# Altium footprint library Altium_Lib.PcbLib: 334 footprints (part 16 of 21)
Each footprint in its own frame and in the unit in brackets; x right, y up, seen from the top. Pads: shape width x height; smd on the part's side, far side on the other; paste and mask are expansions set on the pad; w line width, h text height; cw(c..) or ccw(c..) is an arc to the next point about the centre after c.
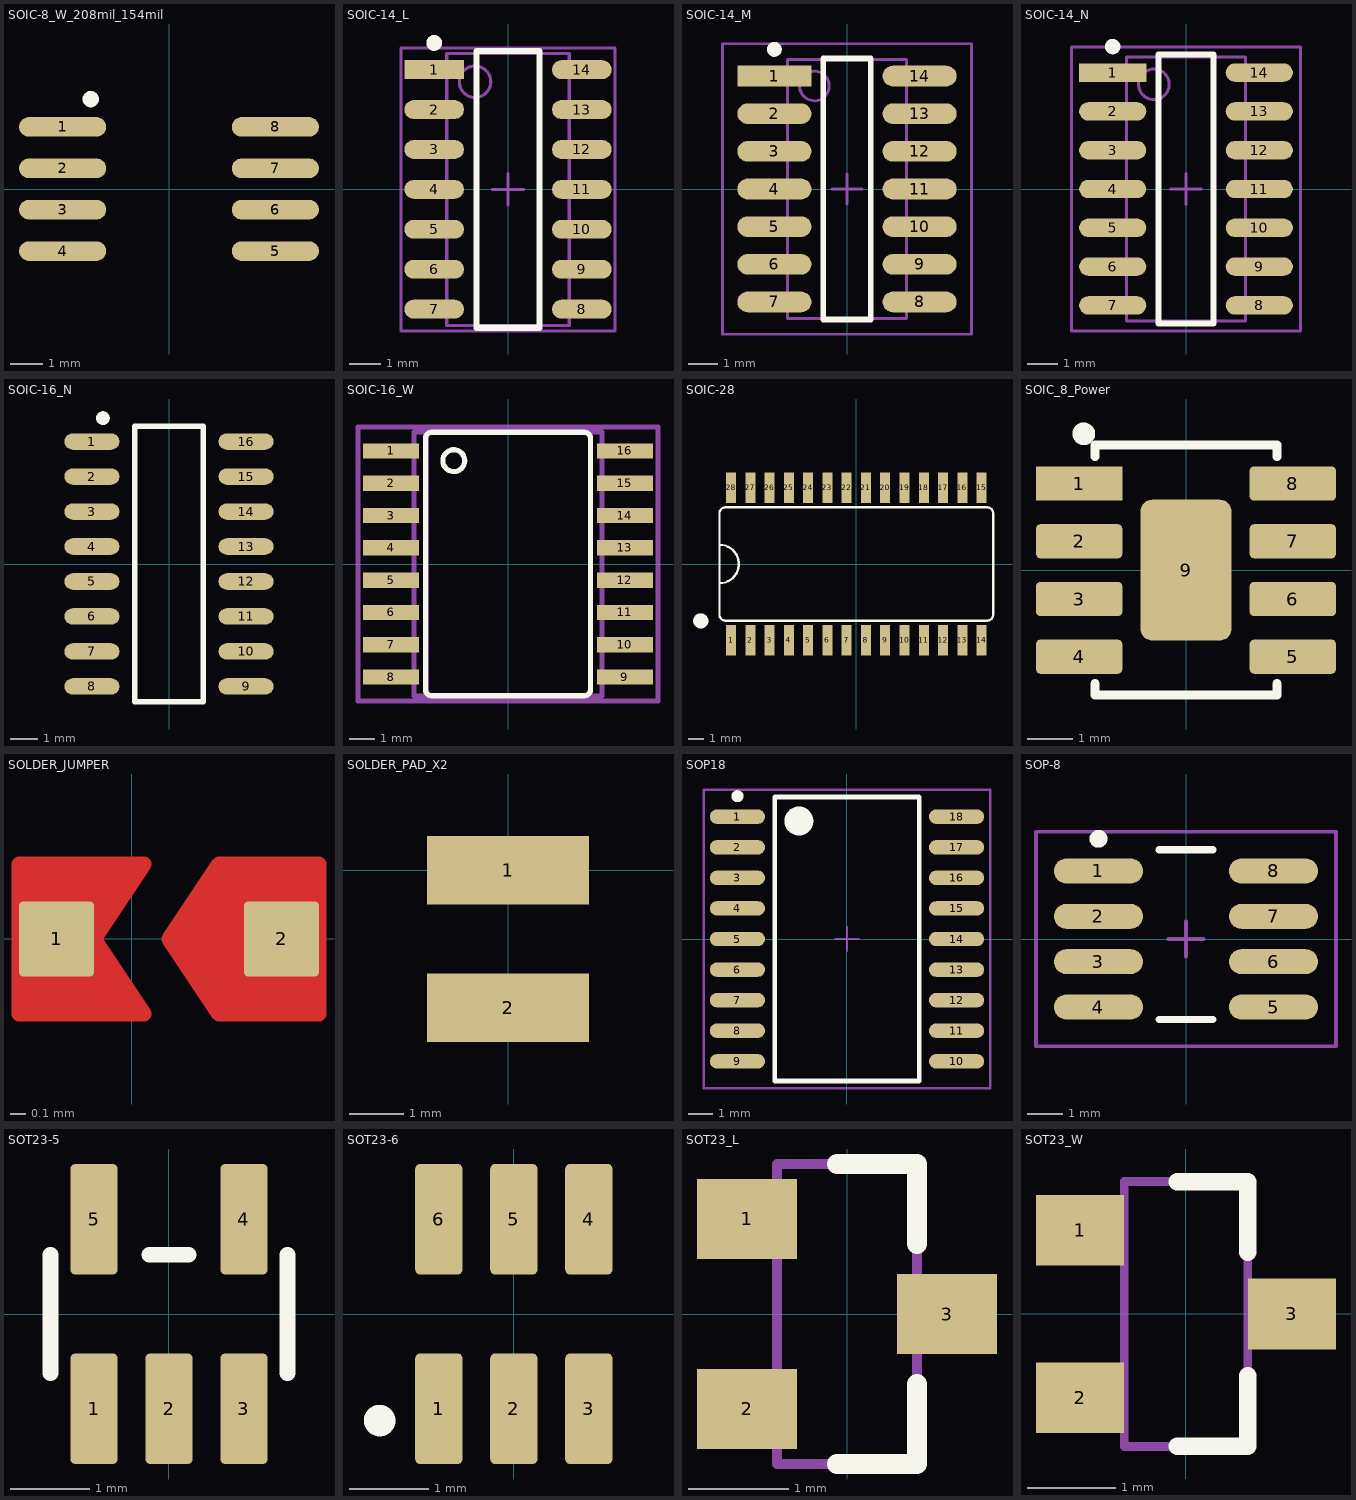
[diagram p15: the footprints below, top view; thin cyan lines are the x and y axes]

## SOIC-8_W_208mil_154mil [mm] "SOIC, 8-Leads, Body 4.9x3.9mm, Pitch 1.27mm, IPC Medium Density"
height 1.75
pads (8):
  oval 2.675x0.6 smd: 1(-3.263,1.905) 2(-3.263,0.635) 3(-3.263,-0.635) 4(-3.263,-1.905) 5(3.262,-1.905) 6(3.262,-0.635) 7(3.262,0.635) 8(3.262,1.905)
Top Overlay:
  circle w0.25: c-2.4,2.755 r0.125
3D body "User Library-SOIC8_Wide_5mmx5mm.step": height 1.75, standoff -0.01, extent -4.052,-2.73 4.05,2.73

## SOIC-14_L [mm] "SOIC, 14-Leads, Body 8.7x3.9mm, Pitch 1.27mm, IPC High Density"
height 1.75
pads (14):
  rect 1.9x0.6 smd: 1(-2.35,3.81)
  oval 1.9x0.6 smd: 2(-2.35,2.54) 3(-2.35,1.27) 4(-2.35,0) 5(-2.35,-1.27) 6(-2.35,-2.54) 7(-2.35,-3.81) 8(2.35,-3.81) 9(2.35,-2.54) 10(2.35,-1.27) 11(2.35,0) 12(2.35,1.27) 13(2.35,2.54) 14(2.35,3.81)
Top Overlay:
  circle w0.25: c-2.35,4.66 r0.125
  lines w0.2: -1,-4.4 1,-4.4 1,4.4 -1,4.4 -1,-4.4
Mechanical 13:
  circle w0.1: c-1.05,3.425 r0.5
  lines w0.1: -1.95,-4.325 1.95,-4.325 1.95,4.325 -1.95,4.325 -1.95,-4.325
Mechanical 15:
  lines w0.1: -0.5,0 0.5,0 ; 0,-0.5 0,0.5 ; -3.4,-4.5 3.4,-4.5 3.4,4.5 -3.4,4.5 -3.4,-4.5
3D body "SOIC_14.STEP": height 1.75, standoff 0, extent -3.1,-4.375 3.1,4.375

## SOIC-14_M [mm] "SOIC, 14-Leads, Body 8.7x3.9mm, Pitch 1.27mm, IPC Low Density"
height 1.75
pads (14):
  rect 2.5x0.7 smd: 1(-2.45,3.81)
  oval 2.5x0.7 smd: 2(-2.45,2.54) 3(-2.45,1.27) 4(-2.45,0) 5(-2.45,-1.27) 6(-2.45,-2.54) 7(-2.45,-3.81) 8(2.45,-3.81) 9(2.45,-2.54) 10(2.45,-1.27) 11(2.45,0) 12(2.45,1.27) 13(2.45,2.54) 14(2.45,3.81)
Top Overlay:
  circle w0.25: c-2.45,4.71 r0.125
  lines w0.2: -0.8,-4.4 -0.8,4.4 0.8,4.4 0.8,-4.4 -0.8,-4.4
Mechanical 13:
  circle w0.1: c-1.1,3.475 r0.5
  lines w0.1: -2,-4.375 -2,4.375 2,4.375 2,-4.375 -2,-4.375
Mechanical 15:
  lines w0.1: -0.5,0 0.5,0 ; 0,-0.5 0,0.5 ; -4.2,-4.9 -4.2,4.9 4.2,4.9 4.2,-4.9 -4.2,-4.9
3D body "SOIC_14.STEP": height 1.75, standoff 0, extent -3.1,-4.375 3.1,4.375

## SOIC-14_N [mm] "SOIC, 14-Leads, Body 8.7x3.9mm, Pitch 1.27mm, IPC Medium Density"
height 1.75
pads (14):
  rect 2.2x0.6 smd: 1(-2.4,3.81)
  oval 2.2x0.6 smd: 2(-2.4,2.54) 3(-2.4,1.27) 4(-2.4,0) 5(-2.4,-1.27) 6(-2.4,-2.54) 7(-2.4,-3.81) 8(2.4,-3.81) 9(2.4,-2.54) 10(2.4,-1.27) 11(2.4,0) 12(2.4,1.27) 13(2.4,2.54) 14(2.4,3.81)
Top Overlay:
  circle w0.25: c-2.4,4.66 r0.125
  lines w0.2: -0.9,-4.4 0.9,-4.4 0.9,4.4 -0.9,4.4 -0.9,-4.4
Mechanical 13:
  circle w0.1: c-1.05,3.425 r0.5
  lines w0.1: -1.95,-4.325 1.95,-4.325 1.95,4.325 -1.95,4.325 -1.95,-4.325
Mechanical 15:
  lines w0.1: -0.5,0 0.5,0 ; 0,-0.5 0,0.5 ; -3.75,-4.65 3.75,-4.65 3.75,4.65 -3.75,4.65 -3.75,-4.65
3D body "SOIC_14.STEP": height 1.75, standoff 0, extent -3.1,-4.375 3.1,4.375

## SOIC-16_N [mm] "SOIC, 16-Leads, Body 9.9x3.9mm, Pitch 1.27mm, IPC Medium Density"
height 1.75
pads (16):
  oval 2x0.6 smd: 1(-2.8,4.445) 2(-2.8,3.175) 3(-2.8,1.905) 4(-2.8,0.635) 5(-2.8,-0.635) 6(-2.8,-1.905) 7(-2.8,-3.175) 8(-2.8,-4.445) 9(2.8,-4.445) 10(2.8,-3.175) 11(2.8,-1.905) 12(2.8,-0.635) 13(2.8,0.635) 14(2.8,1.905) 15(2.8,3.175) 16(2.8,4.445)
Top Overlay:
  circle w0.25: c-2.4,5.295 r0.125
  lines w0.2: -1.25,-5 -1.25,5 1.25,5 1.25,-5 -1.25,-5
3D body "SOIC_16_150mil.STEP": height 1.75, standoff 0, extent -3.1,-5 3.1,5

## SOIC-16_W [mm]
pads (16):
  rect 2.2x0.6 smd: 1(-4.6,4.445) 2(-4.6,3.175) 3(-4.6,1.905) 4(-4.6,0.635) 5(-4.6,-0.635) 6(-4.6,-1.905) 7(-4.6,-3.175) 8(-4.6,-4.445) 9(4.6,-4.445) 10(4.6,-3.175) 11(4.6,-1.905) 12(4.6,-0.635) 13(4.6,0.635) 14(4.6,1.905) 15(4.6,3.175) 16(4.6,4.445)
Top Overlay:
  circle w0.203: c-2.134,4.064 r0.431
  lines w0.203: -3.251,-4.928 ccw(c-2.997,-4.928) -2.997,-5.182 2.997,-5.182 ccw(c2.997,-4.928) 3.251,-4.928 3.251,4.928 ccw(c2.997,4.928) 2.997,5.182 -2.997,5.182 ccw(c-2.997,4.928) -3.251,4.928 -3.251,-4.928
Mechanical 16:
  region: -5.32,4.69 -5.32,4.2 -3.8,4.2 -3.8,4.69
  region: -5.32,3.42 -5.32,2.93 -3.8,2.93 -3.8,3.42
  region: -5.32,2.15 -5.32,1.66 -3.8,1.66 -3.8,2.15
  region: -5.32,0.88 -5.32,0.39 -3.8,0.39 -3.8,0.88
  region: -5.32,-0.39 -5.32,-0.88 -3.8,-0.88 -3.8,-0.39
  region: -5.32,-1.66 -5.32,-2.15 -3.8,-2.15 -3.8,-1.66
  region: -5.32,-2.93 -5.32,-3.42 -3.8,-3.42 -3.8,-2.93
  region: -5.32,-4.2 -5.32,-4.69 -3.8,-4.69 -3.8,-4.2
  region: 3.8,-4.2 3.8,-4.69 5.32,-4.69 5.32,-4.2
  region: 3.8,-2.93 3.8,-3.42 5.32,-3.42 5.32,-2.93
  region: 3.8,-1.66 3.8,-2.15 5.32,-2.15 5.32,-1.66
  region: 3.8,-0.39 3.8,-0.88 5.32,-0.88 5.32,-0.39
  region: 3.8,0.88 3.8,0.39 5.32,0.39 5.32,0.88
  region: 3.8,2.15 3.8,1.66 5.32,1.66 5.32,2.15
  region: 3.8,3.42 3.8,2.93 5.32,2.93 5.32,3.42
  region: 3.8,4.69 3.8,4.2 5.32,4.2 5.32,4.69
  lines w0.2: -5.9,-5.395 -5.9,5.395 5.9,5.395 5.9,-5.395 -5.9,-5.395
  lines w0.203: -3.2,-5.19 -3.2,5.19 ; -3.2,-5.19 3.7,-5.19 3.7,5.19 -3.2,5.19 ; -3.2,-5.19 -3.7,-5.19 -3.7,5.19 -3.2,5.19
3D body "User Library-SOIC16_Wide_JEDEC_MS-013AA.STEP": height 2.72, standoff 0.07, extent -5.425,-5.25 5.205,5.25

## SOIC-28 [mil] "SO28L"
pads (28):
  rect 26x80 smd: 1(-325,-198) 2(-275,-198) 3(-225,-198) 4(-175,-198) 5(-125,-198) 6(-75,-198) 7(-25,-198) 8(25,-198) 9(75,-198) 10(125,-198) 11(175,-198) 12(225,-198) 13(275,-198) 14(325,-198) 15(325,198) 16(275,198) 17(225,198) 18(175,198) 19(125,198) 20(75,198) 21(25,198) 22(-25,198) 23(-75,198) 24(-125,198) 25(-175,198) 26(-225,198) 27(-275,198) 28(-325,198)
Top Overlay:
  circle w19.68: c-403.54,-147.64 r9.84
  lines w6: -355,-50 ccw(c-355,0) -355,50 ; -355,-50 -355,-132 ccw(c-340,-132) -340,-147 340,-147 ccw(c340,-132) 355,-132 355,132 ccw(c340,132) 340,147 -340,147 ccw(c-340,132) -355,132 -355,50 ; -355,-50 -355,50
3D body "User Library-28-SOIC.STEP": height 107.28, standoff -0.98, extent -352.36,-206.69 352.36,198.82

## SOIC_8_Power [mm] "8-PowerSOIC (0.154\", 3.90mm Width)"
height 1.47
pads (9):
  rect 1.9x0.75 smd: 1(-2.35,1.905)
  rrect25% 1.9x0.75 smd: 2(-2.35,0.635) 3(-2.35,-0.635) 4(-2.35,-1.905) 5(2.35,-1.905) 6(2.35,-0.635) 7(2.35,0.635) 8(2.35,1.905)
  rrect25% 2x3.1 smd: 9(0,0)
Top Overlay:
  circle w0.25: c-2.25,3 r0.125
  lines w0.2: -2,-2.5 -2,-2.75 0,-2.75 2,-2.75 2,-2.5 ; -2,2.5 -2,2.75 0,2.75 2,2.75 2,2.5
3D body "SOIC_8.STEP": height 1.75, standoff 0, extent -3.006,-2.5 3.006,2.5

## SOLDER_JUMPER [mm]
pads (2):
  rrect10% 0.5x0.5 smd mask+0.05: 1(-0.5,0) 2(1,0)
Top Layer:
  region: -0.75,-0.5 0.083,-0.5 -0.25,0 0.083,0.5 -0.75,0.5
  region: 0.583,-0.5 0.25,0 0.583,0.5 1.25,0.5 1.25,-0.5
  lines w0.1: -0.75,-0.5 0.083,-0.5 -0.25,0 0.083,0.5 -0.75,0.5 -0.75,-0.5 ; 0.25,0 0.583,0.5 1.25,0.5 1.25,-0.5 0.583,-0.5 0.25,0

## SOLDER_PAD_X2 [mm]
pads (2):
  rect 3x1.27 smd: 1(0,0) 2(0,-2.54)

## SOP18 [mm] "18-Pin Small Outline Integrated Circuit 1.27 mm Pitch, IPC Medium Density"
height 2.65
pads (18):
  oval 2.3x0.6 smd: 1(-4.55,5.08) 2(-4.55,3.81) 3(-4.55,2.54) 4(-4.55,1.27) 5(-4.55,0) 6(-4.55,-1.27) 7(-4.55,-2.54) 8(-4.55,-3.81) 9(-4.55,-5.08) 10(4.55,-5.08) 11(4.55,-3.81) 12(4.55,-2.54) 13(4.55,-1.27) 14(4.55,0) 15(4.55,1.27) 16(4.55,2.54) 17(4.55,3.81) 18(4.55,5.08)
Top Overlay:
  circle w0.6: c-2,4.9 r0.3
  circle w0.25: c-4.55,5.93 r0.125
  lines w0.2: -3,-5.9 3,-5.9 3,5.9 -3,5.9 -3,-5.9
Mechanical 15:
  lines w0.1: -0.5,0 0.5,0 ; 0,-0.5 0,0.5 ; -5.95,-6.2 5.95,-6.2 5.95,6.2 -5.95,6.2 -5.95,-6.2
3D body "SW3dPS-SOIC18-300.STEP": height 2.65, standoff 0, extent -5.05,-5.765 5.25,5.765

## SOP-8 [mm] "SOP, 8-Leads, Body 4.9x3.9mm, Pitch 1.27mm, IPC Low Density"
height 1.75
pads (8):
  oval 2.5x0.7 smd: 1(-2.45,1.905) 2(-2.45,0.635) 3(-2.45,-0.635) 4(-2.45,-1.905) 5(2.45,-1.905) 6(2.45,-0.635) 7(2.45,0.635) 8(2.45,1.905)
Top Overlay:
  circle w0.25: c-2.45,2.805 r0.125
  lines w0.2: -0.75,-2.25 0.75,-2.25 ; -0.75,2.5 0.75,2.5
Mechanical 15:
  lines w0.1: -0.5,0 0.5,0 ; 0,-0.5 0,0.5 ; -4.2,-3 4.2,-3 4.2,3 -4.2,3 -4.2,-3
3D body "SOIC_8.STEP": height 1.75, standoff 0, extent -3.006,-2.5 3.006,2.5

## SOT23-5 [mm] "SOT-23/SC-74A; 5 Leads; Body 3 x 3 mm, inc. leads (LxW max)"
height 1.45
pads (5):
  rrect20% 0.6x1.4 smd: 1(-0.95,-1.2) 2(0,-1.2) 3(0.95,-1.2) 4(0.95,1.2) 5(-0.95,1.2)
Top Overlay:
  lines w0.2: -1.5,-0.75 -1.5,0.75 ; -0.25,0.75 0.25,0.75 ; 1.5,-0.75 1.5,0.75
3D body "SOT_23_5.STEP": height 1.44, standoff -0.02, extent -1.5,-1.5 1.5,1.5

## SOT23-6 [mm] "SOT-23/SC-74A; 5 Leads; Body 3 x 3 mm, inc. leads (LxW max)"
height 1.45
pads (6):
  rrect20% 0.6x1.4 smd mask+0.076: 1(-0.95,-1.2) 2(0,-1.2) 3(0.95,-1.2) 4(0.95,1.2) 5(0,1.2) 6(-0.95,1.2)
Top Overlay:
  circle w0.2: c-1.7,-1.35 r0.1
3D body "SOT_23_6.STEP": height 1.44, standoff -0.02, extent -1.5,-1.5 1.5,1.5

## SOT23_L [mm] "SOT23, 3-Leads, Body 2.9x1.3mm, Pitch 0.95mm, Lead Span 2.3mm, IPC High Density"
height 1.1
pads (3):
  rect 1x0.8 smd: 1(-1,0.95) 2(-1,-0.95) 3(1,0)
Top Overlay:
  lines w0.2: -0.1,-1.5 0.7,-1.5 0.7,-0.7 ; -0.1,1.5 0.7,1.5 0.7,0.7
Mechanical 13:
  lines w0.1: -0.7,-1.5 -0.7,1.5 0.7,1.5 0.7,-1.5 -0.7,-1.5
3D body "SOT23_3.STEP": height 0.97, standoff -0.01, extent -1.274,-1.46 1.274,1.46

## SOT23_W [mm] "SOT23, 3-Leads, Body 2.9x1.3mm, Pitch 0.95mm, Lead Span 2.3mm, IPC High Density"
height 1.1
pads (3):
  rect 1x0.8 smd: 1(-1.2,0.95) 2(-1.2,-0.95) 3(1.2,0)
Top Overlay:
  lines w0.2: -0.1,-1.5 0.7,-1.5 0.7,-0.7 ; -0.1,1.5 0.7,1.5 0.7,0.7
Mechanical 13:
  lines w0.1: -0.7,-1.5 0.7,-1.5 0.7,1.5 -0.7,1.5 -0.7,-1.5
3D body "SOT23_3.STEP": height 0.97, standoff -0.01, extent -1.274,-1.46 1.274,1.46